# Altium footprint library ICs And Semiconductors SMD.PcbLib: 943 footprints (part 1 of 60)
Each footprint in its own frame and in the unit in brackets; x right, y up, seen from the top. Pads: shape width x height; smd on the part's side, far side on the other; paste and mask are expansions set on the pad; w line width, h text height; cw(c..) or ccw(c..) is an arc to the next point about the centre after c.
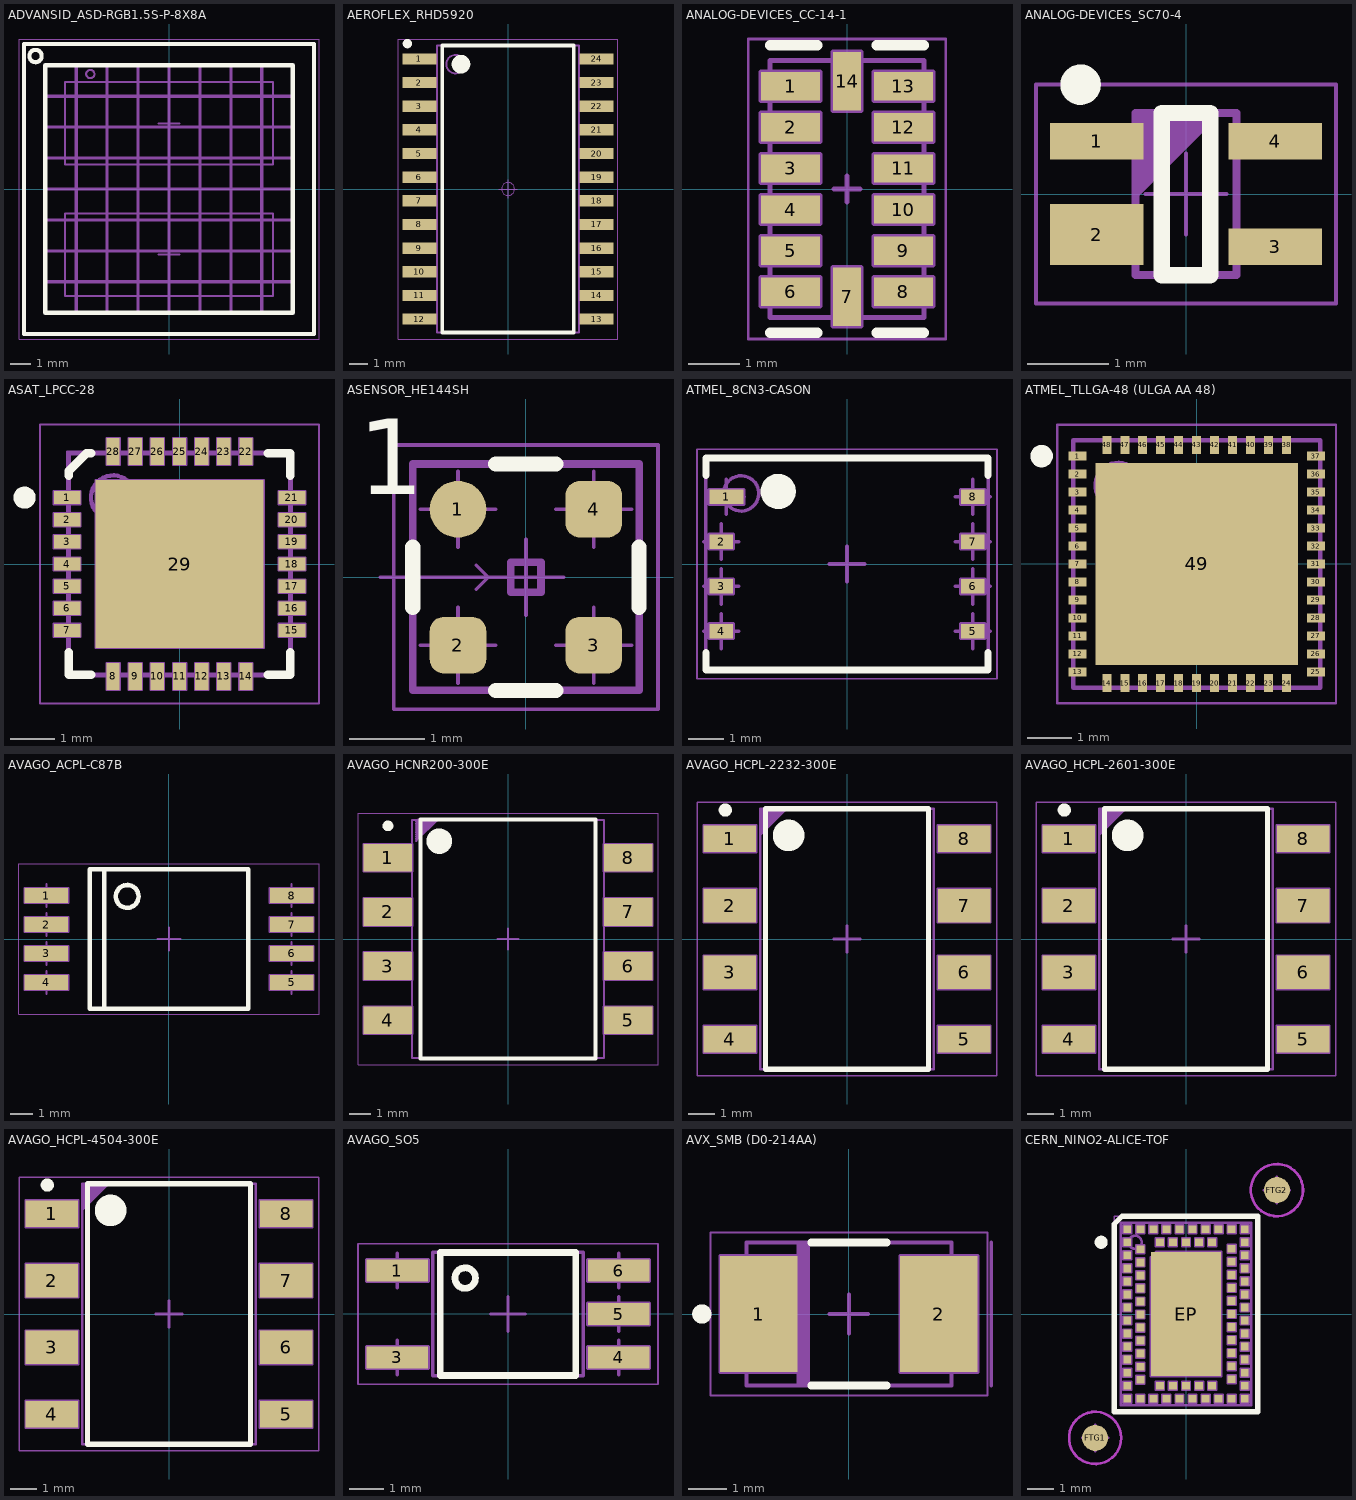
[diagram p0: the footprints below, top view; thin cyan lines are the x and y axes]

## ADVANSID_ASD-RGB1.5S-P-8X8A [mm] "8x8 Monolithic Array of 1.5x1.5 mm2 SiPMs (Silicon PhotoMultiplier), Body 14.05 x 14.05x 2.7mm"
height 2.7
Top Overlay:
  circle w0.2: c-6.475,6.45 r0.3
  lines w0.2: -7.025,-7.025 7.025,-7.025 7.025,7.025 -7.025,7.025 -7.025,-7.025 ; -6,-6 6,-6 6,6 -6,6 -6,-6
Mechanical 8:
  lines w0.1: -0.5,-3.18 0,-3.18 ; -0.5,0 0,0 ; -0.5,3.18 0,3.18 ; 0,-3.68 0,-3.18 ; 0,-2.68 0,-3.18 ; 0,-0.5 0,0 ; 0,0.5 0,0 ; 0,2.68 0,3.18 ; 0,3.68 0,3.18 ; 0.5,-3.18 0,-3.18 ; 0.5,0 0,0 ; 0.5,3.18 0,3.18 ; -5.05,-5.18 5.05,-5.18 5.05,-1.18 -5.05,-1.18 -5.05,-5.18 ; -5.05,1.18 5.05,1.18 5.05,5.18 -5.05,5.18 -5.05,1.18
  text "1" at -4.625,4.05 h0.8
  text "20" at 3.425,4.125 h0.8
  text "21" at 3.325,1.5 h0.8
  text "40" at -4.825,1.7 h0.8
  text "80" at -4.825,-4.66 h0.8
  text "61" at 3.325,-4.86 h0.8
  text "60" at 3.425,-2.235 h0.8
  text "41" at -4.625,-2.31 h0.8
Mechanical 14:
  drawing of 266 lines, arcs and shapes, not listed
  text "1" at -5.375,4.875 h0.8
  text "64" at 4.6,-5.65 h0.8
  text "9" at -5.525,3.375 h0.8
  text "8" at 5.125,4.875 h0.8
Mechanical 15:
  lines w0.05: -7.275,-7.275 7.275,-7.275 7.275,7.275 -7.275,7.275 -7.275,-7.275
3D body "ADVANSID_ASD-RGB1.5S-P-8X8A.stp": height 3, standoff 0.3, extent -7.025,-7.025 7.025,7.025

## AEROFLEX_RHD5920 [mm] "Hermetic Ceramic SOIC, 1.27mm Pitch; 24 Pin, 7.62mm W X 15.59mm L X 3.048mm H Body"
height 3.048
pads (24):
  rect 1.8x0.6 smd: 1(-4.75,6.985) 2(-4.75,5.715) 3(-4.75,4.445) 4(-4.75,3.175) 5(-4.75,1.905) 6(-4.75,0.635) 7(-4.75,-0.635) 8(-4.75,-1.905) 9(-4.75,-3.175) 10(-4.75,-4.445) 11(-4.75,-5.715) 12(-4.75,-6.985) 13(4.75,-6.985) 14(4.75,-5.715) 15(4.75,-4.445) 16(4.75,-3.175) 17(4.75,-1.905) 18(4.75,-0.635) 19(4.75,0.635) 20(4.75,1.905) 21(4.75,3.175) 22(4.75,4.445) 23(4.75,5.715) 24(4.75,6.985)
Top Overlay:
  circle w0.25: c-5.4,7.8 r0.125
  circle w0.5: c-2.525,6.7 r0.25
  lines w0.2: -3.525,-7.7 -3.525,7.7 3.525,7.7 3.525,-7.7 -3.525,-7.7
Mechanical 14:
  circle w0.1: c-2.81,6.7 r0.5
  lines w0.1: -3.81,-7.7 -3.81,7.7 3.81,7.7 3.81,-7.7 -3.81,-7.7
Mechanical 15:
  circle w0.05: c0,0 r0.35
  lines w0.05: -0.5,0 0.5,0 ; 0,-0.5 0,0.5 ; -5.9,-8.05 -5.9,8.05 5.9,8.05 5.9,-8.05 -5.9,-8.05
3D body "AEROFLEX_RHD5920.stp": height 3.05, standoff 0, extent -5.16,-7.8 5.16,7.8

## ANALOG-DEVICES_CC-14-1 [mm] "LGA, 0.50mm pitch, 14 Pin, 3.00mm L X 5.00mm W X 1.00mm H body, ANALOG DEVICE CC-14-1"
height 1
pads (14):
  rect 1.145x0.55 smd: 1(-1.098,2) 2(-1.098,1.2) 3(-1.098,0.4) 4(-1.098,-0.4) 5(-1.098,-1.2) 6(-1.098,-2) 8(1.098,-2) 9(1.098,-1.2) 10(1.098,-0.4) 11(1.098,0.4) 12(1.098,1.2) 13(1.098,2)
  rect 0.55x1.145 smd: 7(0,-2.098) 14(0,2.098)
Top Overlay:
  lines w0.2: -1.5,-2.8 -0.575,-2.8 ; -1.5,2.8 -0.575,2.8 ; 0.575,-2.8 1.5,-2.8 ; 0.575,2.8 1.5,2.8
Mechanical 8:
  lines w0.1: -1.348,-2 -1.098,-2 ; -1.348,-1.2 -1.098,-1.2 ; -1.348,-0.4 -1.098,-0.4 ; -1.348,0.4 -1.098,0.4 ; -1.348,1.2 -1.098,1.2 ; -1.348,2 -1.098,2 ; -1.098,-2.25 -1.098,-2 ; -1.098,-1.75 -1.098,-2 ; -1.098,-1.45 -1.098,-1.2 ; -1.098,-0.95 -1.098,-1.2 ; -1.098,-0.65 -1.098,-0.4 ; -1.098,-0.15 -1.098,-0.4 ; -1.098,0.15 -1.098,0.4 ; -1.098,0.65 -1.098,0.4 ; -1.098,0.95 -1.098,1.2 ; -1.098,1.45 -1.098,1.2 ; -1.098,1.75 -1.098,2 ; -1.098,2.25 -1.098,2 ; -0.848,-2 -1.098,-2 ; -0.848,-1.2 -1.098,-1.2 ; -0.848,-0.4 -1.098,-0.4 ; -0.848,0.4 -1.098,0.4 ; -0.848,1.2 -1.098,1.2 ; -0.848,2 -1.098,2 ; -0.25,-2.098 0,-2.098 ; -0.25,0 0,0 ; -0.25,2.098 0,2.098 ; 0,-2.348 0,-2.098 ; 0,-1.848 0,-2.098 ; 0,-0.25 0,0 ; 0,0.25 0,0 ; 0,1.848 0,2.098 ; 0,2.348 0,2.098 ; 0.25,-2.098 0,-2.098 ; 0.25,0 0,0 ; 0.25,2.098 0,2.098 ; 0.848,-2 1.098,-2 ; 0.848,-1.2 1.098,-1.2 ; 0.848,-0.4 1.098,-0.4 ; 0.848,0.4 1.098,0.4 ; 0.848,1.2 1.098,1.2 ; 0.848,2 1.098,2 ; 1.098,-2.25 1.098,-2 ; 1.098,-1.75 1.098,-2 ; 1.098,-1.45 1.098,-1.2 ; 1.098,-0.95 1.098,-1.2 ; 1.098,-0.65 1.098,-0.4 ; 1.098,-0.15 1.098,-0.4 ; 1.098,0.15 1.098,0.4 ; 1.098,0.65 1.098,0.4 ; 1.098,0.95 1.098,1.2 ; 1.098,1.45 1.098,1.2 ; 1.098,1.75 1.098,2 ; 1.098,2.25 1.098,2 ; 1.348,-2 1.098,-2 ; 1.348,-1.2 1.098,-1.2 ; 1.348,-0.4 1.098,-0.4 ; 1.348,0.4 1.098,0.4 ; 1.348,1.2 1.098,1.2 ; 1.348,2 1.098,2 ; -1.67,-2.275 -0.525,-2.275 -0.525,-1.725 -1.67,-1.725 -1.67,-2.275 ; -1.67,-1.475 -0.525,-1.475 -0.525,-0.925 -1.67,-0.925 -1.67,-1.475 ; -1.67,-0.675 -0.525,-0.675 -0.525,-0.125 -1.67,-0.125 -1.67,-0.675 ; -1.67,0.125 -0.525,0.125 -0.525,0.675 -1.67,0.675 -1.67,0.125 ; -1.67,0.925 -0.525,0.925 -0.525,1.475 -1.67,1.475 -1.67,0.925 ; -1.67,1.725 -0.525,1.725 -0.525,2.275 -1.67,2.275 -1.67,1.725 ; -0.275,-2.67 0.275,-2.67 0.275,-1.525 -0.275,-1.525 -0.275,-2.67 ; -0.275,1.525 0.275,1.525 0.275,2.67 -0.275,2.67 -0.275,1.525 ; 0.525,-2.275 0.525,-1.725 1.67,-1.725 1.67,-2.275 0.525,-2.275 ; 0.525,-1.475 0.525,-0.925 1.67,-0.925 1.67,-1.475 0.525,-1.475 ; 0.525,-0.675 0.525,-0.125 1.67,-0.125 1.67,-0.675 0.525,-0.675 ; 0.525,0.125 0.525,0.675 1.67,0.675 1.67,0.125 0.525,0.125 ; 0.525,0.925 0.525,1.475 1.67,1.475 1.67,0.925 0.525,0.925 ; 0.525,1.725 0.525,2.275 1.67,2.275 1.67,1.725 0.525,1.725
Mechanical 14:
  circle w0.1: c-1,2 r0.25
  lines w0.1: -1.5,-2.5 -1.5,2.5 1.5,2.5 1.5,-2.5 -1.5,-2.5
Mechanical 15:
  lines w0.05: -1.92,-2.92 -1.92,2.92 1.92,2.92 1.92,-2.92 -1.92,-2.92
3D body "ANALOG-DEVICES_CC-14-1.stp": height 0.79, standoff 0, extent -1.5,-2.5 1.5,2.5

## ANALOG-DEVICES_SC70-4 [mm] "SC70-4, SOT, 0.65mm Pitch, 4 pin, 1.25mm W X 2.00mm L X 1.10mm H, IPC Medium Density"
height 1.1
pads (4):
  rect 1.15x0.45 smd: 1(-1.1,0.65) 3(1.1,-0.65) 4(1.1,0.65)
  rect 1.15x0.75 smd: 2(-1.1,-0.5)
Top Overlay:
  circle w0.25: c-1.3,1.35 r0.125
  lines w0.2: -0.3,-1 -0.3,1 0.3,1 0.3,-1 -0.3,-1
Mechanical 14:
  lines w0.1: -0.625,0 0.375,1 ; -0.625,0.1 0.275,1 ; -0.625,0.2 0.175,1 ; -0.625,0.3 0.075,1 ; -0.625,0.4 -0.025,1 ; -0.625,0.5 -0.125,1 ; -0.625,0.6 -0.225,1 ; -0.625,0.7 -0.325,1 ; -0.625,0.8 -0.425,1 ; -0.625,0.9 -0.525,1 ; -0.625,-1 -0.625,1 0.625,1 0.625,-1 -0.625,-1
Mechanical 15:
  lines w0.05: -0.5,0 0.5,0 ; 0,-0.5 0,0.5 ; -1.85,-1.35 -1.85,1.35 1.85,1.35 1.85,-1.35 -1.85,-1.35
3D body "ANALOG-DEVICES_SC70-4.stp": height 1.1, standoff 0, extent -1.2,-1.1 1.2,1.1

## ASAT_LPCC-28 [mm] "QFN, 0.50mm Pitch, Square; 28 Pin, 5.00mm L X 5.00mm W X 1.0mm H Body (w/thermal tab 3.8 X 3.8mm)"
height 1
pads (29):
  rect 0.6x0.3 smd: 1(-2.54,1.5) 2(-2.54,1) 3(-2.54,0.5) 4(-2.54,0) 5(-2.54,-0.5) 6(-2.54,-1) 7(-2.54,-1.5) 15(2.54,-1.5) 16(2.54,-1) 17(2.54,-0.5) 18(2.54,0) 19(2.54,0.5) 20(2.54,1) 21(2.54,1.5)
  rect 0.3x0.6 smd: 8(-1.5,-2.54) 9(-1,-2.54) 10(-0.5,-2.54) 11(0,-2.54) 12(0.5,-2.54) 13(1,-2.54) 14(1.5,-2.54) 22(1.5,2.54) 23(1,2.54) 24(0.5,2.54) 25(0,2.54) 26(-0.5,2.54) 27(-1,2.54) 28(-1.5,2.54)
  rect 3.8x3.8 smd: 29(0,0)
Top Overlay:
  circle w0.25: c-3.5,1.5 r0.125
  lines w0.2: -2.5,-2 -2.5,-2.5 -2,-2.5 ; -2.5,2 -2.5,2.1 -2.1,2.5 -2,2.5 ; 2,-2.5 2.5,-2.5 2.5,-2 ; 2,2.5 2.5,2.5 2.5,2
Mechanical 8:
  drawing of 180 lines, arcs and shapes, not listed
Mechanical 14:
  circle w0.1: c-1.5,1.5 r0.5
  lines w0.1: -2.5,-2.5 2.5,-2.5 2.5,2.5 -2.5,2.5 -2.5,-2.5
Mechanical 15:
  circle w0.05: c0,0 r0.35
  lines w0.05: -0.5,0 0.5,0 ; 0,-0.5 0,0.5 ; -3.15,-3.15 3.15,-3.15 3.15,3.15 -3.15,3.15 -3.15,-3.15
3D body "QFN50P500X500X100-29N-S380.stp": height 1, standoff 0, extent -2.5,-2.5 2.5,2.5

## ASENSOR_HE144SH [mm] "HE144 Series Analog Hall Sensor, Body 3mm x 3mm x 0.5mm"
height 0.5
pads (4):
  round 0.75 smd: 1(-0.9,0.9)
  rrect50% 0.75x0.75 smd: 2(-0.9,-0.9) 3(0.9,-0.9) 4(0.9,0.9)
Top Overlay:
  lines w0.2: -1.5,-0.4 -1.5,0.4 ; -0.4,-1.5 0.4,-1.5 ; -0.4,1.5 0.4,1.5 ; 1.5,-0.4 1.5,0.4
  text "1" at -2.225,1.1 h1
Mechanical 8:
  circle w0.05: c-0.9,0.9 r0.3
  lines w0.05: -1.925,0 -0.5,0 ; -1.4,-0.9 -0.9,-0.9 ; -1.4,0.9 -0.9,0.9 ; -0.9,-1.4 -0.9,-0.9 ; -0.9,-0.4 -0.9,-0.9 ; -0.9,0.4 -0.9,0.9 ; -0.9,1.4 -0.9,0.9 ; -0.659,0.159 -0.5,0 ; -0.4,-0.9 -0.9,-0.9 ; -0.4,0.9 -0.9,0.9 ; 0,-0.5 0,0 ; 0,0.5 0,0 ; 0.4,-0.9 0.9,-0.9 ; 0.4,0.9 0.9,0.9 ; 0.5,0 0,0 ; 0.9,-1.4 0.9,-0.9 ; 0.9,-0.4 0.9,-0.9 ; 0.9,0.4 0.9,0.9 ; 0.9,1.4 0.9,0.9 ; 1.4,-0.9 0.9,-0.9 ; 1.4,0.9 0.9,0.9 ; -0.5,0 0,0 ; -0.5,0 -0.659,-0.159 -0.5,0 ; -1.2,-1.2 -0.6,-1.2 -0.6,-0.6 -1.2,-0.6 -1.2,-1.2 ; 0.6,-1.2 0.6,-0.6 1.2,-0.6 1.2,-1.2 0.6,-1.2 ; 0.6,0.6 0.6,1.2 1.2,1.2 1.2,0.6 0.6,0.6
  text "Center" at -4.625,-0.925 h0.5
  text "Magnetic" at -5.55,-0.175 h0.5
Mechanical 14:
  lines w0.1: -1.5,-1.5 1.5,-1.5 1.5,1.5 -1.5,1.5 -1.5,-1.5 ; -0.2,-0.2 -0.2,0.2 0.2,0.2 0.2,-0.2 -0.2,-0.2
  text "1" at -2.225,1.1 h1
Mechanical 15:
  lines w0.05: -1.75,-1.75 -1.75,1.75 1.75,1.75 1.75,-1.75 -1.75,-1.75
3D body "ASENSOR_HE144SH.stp": height 0.5, standoff 0, extent -1.5,-1.5 1.5,1.5

## ATMEL_8CN3-CASON [mm] "ATMEL 8CN3 Case, SON, 1.27mm Pitch; 8 Pin, 8.00mm W X 6.00mm L X 1.00mm H body"
height 1
pads (8):
  rect 0.97x0.41 smd: 1(-3.415,1.905)
  rect 0.67x0.41 smd: 2(-3.565,0.635) 3(-3.565,-0.635) 4(-3.565,-1.905) 5(3.565,-1.905) 6(3.565,-0.635) 7(3.565,0.635) 8(3.565,1.905)
Top Overlay:
  circle w0.5: c-1.95,2.055 r0.25
  lines w0.2: -4,-2.51 -4,-3 4,-3 4,-2.51 ; -4,2.51 -4,3 4,3 4,2.51
Mechanical 8:
  lines w0.1: -4.065,-1.905 -3.565,-1.905 ; -4.065,-0.635 -3.565,-0.635 ; -4.065,0.635 -3.565,0.635 ; -3.915,1.905 -3.415,1.905 ; -3.565,-2.405 -3.565,-1.905 ; -3.565,-1.405 -3.565,-1.905 ; -3.565,-1.135 -3.565,-0.635 ; -3.565,-0.135 -3.565,-0.635 ; -3.565,0.135 -3.565,0.635 ; -3.565,1.135 -3.565,0.635 ; -3.415,1.405 -3.415,1.905 ; -3.415,2.405 -3.415,1.905 ; -3.065,-1.905 -3.565,-1.905 ; -3.065,-0.635 -3.565,-0.635 ; -3.065,0.635 -3.565,0.635 ; -2.915,1.905 -3.415,1.905 ; -0.5,0 0,0 ; 0,-0.5 0,0 ; 0,0.5 0,0 ; 0.5,0 0,0 ; 3.065,-1.905 3.565,-1.905 ; 3.065,-0.635 3.565,-0.635 ; 3.065,0.635 3.565,0.635 ; 3.065,1.905 3.565,1.905 ; 3.565,-2.405 3.565,-1.905 ; 3.565,-1.405 3.565,-1.905 ; 3.565,-1.135 3.565,-0.635 ; 3.565,-0.135 3.565,-0.635 ; 3.565,0.135 3.565,0.635 ; 3.565,1.135 3.565,0.635 ; 3.565,1.405 3.565,1.905 ; 3.565,2.405 3.565,1.905 ; 4.065,-1.905 3.565,-1.905 ; 4.065,-0.635 3.565,-0.635 ; 4.065,0.635 3.565,0.635 ; 4.065,1.905 3.565,1.905 ; -3.9,-2.11 -3.23,-2.11 -3.23,-1.7 -3.9,-1.7 -3.9,-2.11 ; -3.9,-0.84 -3.23,-0.84 -3.23,-0.43 -3.9,-0.43 -3.9,-0.84 ; -3.9,0.43 -3.23,0.43 -3.23,0.84 -3.9,0.84 -3.9,0.43 ; -3.9,1.7 -2.93,1.7 -2.93,2.11 -3.9,2.11 -3.9,1.7 ; 3.23,-2.11 3.23,-1.7 3.9,-1.7 3.9,-2.11 3.23,-2.11 ; 3.23,-0.84 3.23,-0.43 3.9,-0.43 3.9,-0.84 3.23,-0.84 ; 3.23,0.43 3.9,0.43 3.9,0.84 3.23,0.84 3.23,0.43 ; 3.23,1.7 3.9,1.7 3.9,2.11 3.23,2.11 3.23,1.7
Mechanical 14:
  circle w0.1: c-3,2 r0.5
  lines w0.1: -4,-3 -4,3 4,3 4,-3 -4,-3
Mechanical 15:
  lines w0.05: -4.25,-3.25 -4.25,3.25 4.25,3.25 4.25,-3.25 -4.25,-3.25
3D body "ATMEL_8CN3-CASON.stp": height 1, standoff 0, extent -4,-3 4,3

## ATMEL_TLLGA-48 (ULGA AA 48) [mm] "QFN,0.40mm pitch,square;48 pin,5.50mm L X 5.50mm W X 0.60mm H body (w/pullback leads,thermal tab 4.5 X 4.5mm), IPC Medium Density"
height 0.6
pads (49):
  rect 0.4x0.2 smd: 1(-2.65,2.4) 2(-2.65,2) 3(-2.65,1.6) 4(-2.65,1.2) 5(-2.65,0.8) 6(-2.65,0.4) 7(-2.65,0) 8(-2.65,-0.4) 9(-2.65,-0.8) 10(-2.65,-1.2) 11(-2.65,-1.6) 12(-2.65,-2) 13(-2.65,-2.4) 25(2.65,-2.4) 26(2.65,-2) 27(2.65,-1.6) 28(2.65,-1.2) 29(2.65,-0.8) 30(2.65,-0.4) 31(2.65,0) 32(2.65,0.4) 33(2.65,0.8) 34(2.65,1.2) 35(2.65,1.6) 36(2.65,2) 37(2.65,2.4)
  rect 0.2x0.4 smd: 14(-2,-2.65) 15(-1.6,-2.65) 16(-1.2,-2.65) 17(-0.8,-2.65) 18(-0.4,-2.65) 19(0,-2.65) 20(0.4,-2.65) 21(0.8,-2.65) 22(1.2,-2.65) 23(1.6,-2.65) 24(2,-2.65) 38(2,2.65) 39(1.6,2.65) 40(1.2,2.65) 41(0.8,2.65) 42(0.4,2.65) 43(0,2.65) 44(-0.4,2.65) 45(-0.8,2.65) 46(-1.2,2.65) 47(-1.6,2.65) 48(-2,2.65)
  rect 4.5x4.5 smd: 49(0,0)
Top Overlay:
  circle w0.25: c-3.45,2.4 r0.125
Top Paste:
  region: -1.7,-1.7 -1.7,-0.28 -0.28,-0.28 -0.28,-1.7
  region: 0.28,-1.7 0.28,-0.28 1.7,-0.28 1.7,-1.7
  region: -1.7,0.28 -1.7,1.7 -0.28,1.7 -0.28,0.28
  region: 0.28,0.28 0.28,1.7 1.7,1.7 1.7,0.28
Mechanical 14:
  circle w0.1: c-1.75,1.75 r0.5
  lines w0.1: -2.75,-2.75 -2.75,2.75 2.75,2.75 2.75,-2.75 -2.75,-2.75
  text "1" at 0.45,-0.164 h0.75
Mechanical 15:
  circle w0.05: c0,0 r0.35
  lines w0.05: -0.5,0 0.5,0 ; 0,-0.5 0,0.5 ; -3.1,-3.1 -3.1,3.1 3.1,3.1 3.1,-3.1 -3.1,-3.1
3D body "ATMEL_TLLGA-48 (ULGA AA 48).stp": height 0.6, standoff 0, extent -2.75,-2.75 2.75,2.75

## AVAGO_ACPL-C87B [mm] "8-Leads Stretched Surface Mount SO Package, Body 6.807x5.859mm, Pitch 1.27mm"
height 3.6
pads (8):
  rect 1.905x0.64 smd: 1(-5.372,1.905) 2(-5.372,0.635) 3(-5.372,-0.635) 4(-5.372,-1.905) 5(5.373,-1.905) 6(5.373,-0.635) 7(5.373,0.635) 8(5.373,1.905)
Top Overlay:
  circle w0.2: c-1.832,1.867 r0.5
  lines w0.2: -2.832,-3.052 -2.832,3.052 ; -3.467,-3.052 -3.467,3.052 3.467,3.052 3.467,-3.052 -3.467,-3.052
Mechanical 8:
  lines w0.1: -5.872,-1.905 -5.372,-1.905 ; -5.872,-0.635 -5.372,-0.635 ; -5.872,0.635 -5.372,0.635 ; -5.872,1.905 -5.372,1.905 ; -5.372,-2.405 -5.372,-1.905 ; -5.372,-1.405 -5.372,-1.905 ; -5.372,-1.135 -5.372,-0.635 ; -5.372,-0.135 -5.372,-0.635 ; -5.372,0.135 -5.372,0.635 ; -5.372,1.135 -5.372,0.635 ; -5.372,1.405 -5.372,1.905 ; -5.372,2.405 -5.372,1.905 ; -4.872,-1.905 -5.372,-1.905 ; -4.872,-0.635 -5.372,-0.635 ; -4.872,0.635 -5.372,0.635 ; -4.872,1.905 -5.372,1.905 ; -0.5,0 0,0 ; 0,-0.5 0,0 ; 0,0.5 0,0 ; 0.5,0 0,0 ; 4.873,-1.905 5.373,-1.905 ; 4.873,-0.635 5.373,-0.635 ; 4.873,0.635 5.373,0.635 ; 4.873,1.905 5.373,1.905 ; 5.373,-2.405 5.373,-1.905 ; 5.373,-1.405 5.373,-1.905 ; 5.373,-1.135 5.373,-0.635 ; 5.373,-0.135 5.373,-0.635 ; 5.373,0.135 5.373,0.635 ; 5.373,1.135 5.373,0.635 ; 5.373,1.405 5.373,1.905 ; 5.373,2.405 5.373,1.905 ; 5.873,-1.905 5.373,-1.905 ; 5.873,-0.635 5.373,-0.635 ; 5.873,0.635 5.373,0.635 ; 5.873,1.905 5.373,1.905 ; -6.325,-2.225 -4.42,-2.225 -4.42,-1.585 -6.325,-1.585 -6.325,-2.225 ; -6.325,-0.955 -4.42,-0.955 -4.42,-0.315 -6.325,-0.315 -6.325,-0.955 ; -6.325,0.315 -4.42,0.315 -4.42,0.955 -6.325,0.955 -6.325,0.315 ; -6.325,1.585 -4.42,1.585 -4.42,2.225 -6.325,2.225 -6.325,1.585 ; 4.42,-2.225 6.325,-2.225 6.325,-1.585 4.42,-1.585 4.42,-2.225 ; 4.42,-0.955 6.325,-0.955 6.325,-0.315 4.42,-0.315 4.42,-0.955 ; 4.42,0.315 6.325,0.315 6.325,0.955 4.42,0.955 4.42,0.315 ; 4.42,1.585 6.325,1.585 6.325,2.225 4.42,2.225 4.42,1.585
Mechanical 14:
  circle w0.1: c-1.832,1.867 r0.5
  lines w0.1: -2.832,-3.052 -2.832,3.052 ; -3.467,-3.052 -3.467,3.052 3.467,3.052 3.467,-3.052 -3.467,-3.052
Mechanical 15:
  lines w0.05: -6.575,-3.302 6.575,-3.302 6.575,3.302 -6.575,3.302 -6.575,-3.302
3D body "AVAGO_ACPL-C87B.stp": height 3.61, standoff 0, extent -5.75,-3.052 5.75,3.052

## AVAGO_HCNR200-300E [mm] "DIP Gull Wing Surface Mount, 8-Leads, Body 11.15x9mm, Pitch 2.54mm"
height 4
pads (8):
  rect 2.29x1.3 smd: 1(-5.635,3.81) 2(-5.635,1.27) 3(-5.635,-1.27) 4(-5.635,-3.81) 5(5.635,-3.81) 6(5.635,-1.27) 7(5.635,1.27) 8(5.635,3.81)
Top Overlay:
  circle w0.6: c-3.22,4.585 r0.3
  circle w0.25: c-5.625,5.3 r0.125
  lines w0.2: -4.1,-5.6 -4.1,5.6 4.1,5.6 4.1,-5.6 -4.1,-5.6
Mechanical 8:
  lines w0.1: -6.135,-3.81 -5.635,-3.81 ; -6.135,-1.27 -5.635,-1.27 ; -6.135,1.27 -5.635,1.27 ; -6.135,3.81 -5.635,3.81 ; -5.635,-4.31 -5.635,-3.81 ; -5.635,-3.31 -5.635,-3.81 ; -5.635,-1.77 -5.635,-1.27 ; -5.635,-0.77 -5.635,-1.27 ; -5.635,0.77 -5.635,1.27 ; -5.635,1.77 -5.635,1.27 ; -5.635,3.31 -5.635,3.81 ; -5.635,4.31 -5.635,3.81 ; -5.135,-3.81 -5.635,-3.81 ; -5.135,-1.27 -5.635,-1.27 ; -5.135,1.27 -5.635,1.27 ; -5.135,3.81 -5.635,3.81 ; -0.5,0 0,0 ; 0,-0.5 0,0 ; 0,0.5 0,0 ; 0.5,0 0,0 ; 5.135,-3.81 5.635,-3.81 ; 5.135,-1.27 5.635,-1.27 ; 5.135,1.27 5.635,1.27 ; 5.135,3.81 5.635,3.81 ; 5.635,-4.31 5.635,-3.81 ; 5.635,-3.31 5.635,-3.81 ; 5.635,-1.77 5.635,-1.27 ; 5.635,-0.77 5.635,-1.27 ; 5.635,0.77 5.635,1.27 ; 5.635,1.77 5.635,1.27 ; 5.635,3.31 5.635,3.81 ; 5.635,4.31 5.635,3.81 ; 6.135,-3.81 5.635,-3.81 ; 6.135,-1.27 5.635,-1.27 ; 6.135,1.27 5.635,1.27 ; 6.135,3.81 5.635,3.81 ; -6.78,-4.46 -6.78,-3.16 -4.49,-3.16 -4.49,-4.46 -6.78,-4.46 ; -6.78,-1.92 -6.78,-0.62 -4.49,-0.62 -4.49,-1.92 -6.78,-1.92 ; -6.78,0.62 -6.78,1.92 -4.49,1.92 -4.49,0.62 -6.78,0.62 ; -6.78,3.16 -6.78,4.46 -4.49,4.46 -4.49,3.16 -6.78,3.16 ; 4.49,-4.46 4.49,-3.16 6.78,-3.16 6.78,-4.46 4.49,-4.46 ; 4.49,-1.92 6.78,-1.92 6.78,-0.62 4.49,-0.62 4.49,-1.92 ; 4.49,0.62 6.78,0.62 6.78,1.92 4.49,1.92 4.49,0.62 ; 4.49,3.16 6.78,3.16 6.78,4.46 4.49,4.46 4.49,3.16
Mechanical 14:
  lines w0.1: -4.3,4.6 -3.3,5.6 ; -4.3,4.7 -3.4,5.6 ; -4.3,4.8 -3.5,5.6 ; -4.3,4.9 -3.6,5.6 ; -4.3,5 -3.7,5.6 ; -4.3,5.1 -3.8,5.6 ; -4.3,5.2 -3.9,5.6 ; -4.3,5.3 -4,5.6 ; -4.3,5.4 -4.1,5.6 ; -4.3,5.5 -4.2,5.6 ; -4.5,-5.575 -4.5,5.575 4.5,5.575 4.5,-5.575 -4.5,-5.575
Mechanical 15:
  lines w0.05: -7.03,-5.9 7.03,-5.9 7.03,5.9 -7.03,5.9 -7.03,-5.9
3D body "AVAGO_HCNR200-300E.stp": height 4.01, standoff 0, extent -6.15,-5.65 6.15,5.65

## AVAGO_HCPL-2232-300E [mm] "SOIC, 2.54mm Pitch, 8 Pin, Body 6.35mm W X 9.65mm L X 4.45mm H, AVAGO 8-pin DIP Package With Gull Wing Surface Mount Option 300"
height 4.45
pads (8):
  rect 2x1.016 smd: 1(-4.45,3.81) 4(-4.45,-3.81) 5(4.45,-3.81) 8(4.45,3.81)
  rect 2x1.27 smd: 2(-4.45,1.27) 3(-4.45,-1.27) 6(4.45,-1.27) 7(4.45,1.27)
Top Overlay:
  circle w0.25: c-4.625,4.9 r0.125
  circle w0.6: c-2.22,3.935 r0.3
  lines w0.2: -3.1,-4.95 -3.1,4.95 3.1,4.95 3.1,-4.95 -3.1,-4.95
Mechanical 8:
  lines w0.1: -4.95,-3.81 -4.45,-3.81 ; -4.95,-1.27 -4.45,-1.27 ; -4.95,1.27 -4.45,1.27 ; -4.95,3.81 -4.45,3.81 ; -4.45,-4.31 -4.45,-3.81 ; -4.45,-3.31 -4.45,-3.81 ; -4.45,-1.77 -4.45,-1.27 ; -4.45,-0.77 -4.45,-1.27 ; -4.45,0.77 -4.45,1.27 ; -4.45,1.77 -4.45,1.27 ; -4.45,3.31 -4.45,3.81 ; -4.45,4.31 -4.45,3.81 ; -3.95,-3.81 -4.45,-3.81 ; -3.95,-1.27 -4.45,-1.27 ; -3.95,1.27 -4.45,1.27 ; -3.95,3.81 -4.45,3.81 ; -0.5,0 0,0 ; 0,-0.5 0,0 ; 0,0.5 0,0 ; 0.5,0 0,0 ; 3.95,-3.81 4.45,-3.81 ; 3.95,-1.27 4.45,-1.27 ; 3.95,1.27 4.45,1.27 ; 3.95,3.81 4.45,3.81 ; 4.45,-4.31 4.45,-3.81 ; 4.45,-3.31 4.45,-3.81 ; 4.45,-1.77 4.45,-1.27 ; 4.45,-0.77 4.45,-1.27 ; 4.45,0.77 4.45,1.27 ; 4.45,1.77 4.45,1.27 ; 4.45,3.31 4.45,3.81 ; 4.45,4.31 4.45,3.81 ; 4.95,-3.81 4.45,-3.81 ; 4.95,-1.27 4.45,-1.27 ; 4.95,1.27 4.45,1.27 ; 4.95,3.81 4.45,3.81 ; -5.45,-4.318 -3.45,-4.318 -3.45,-3.302 -5.45,-3.302 -5.45,-4.318 ; -5.45,-1.905 -5.45,-0.635 -3.45,-0.635 -3.45,-1.905 -5.45,-1.905 ; -5.45,0.635 -5.45,1.905 -3.45,1.905 -3.45,0.635 -5.45,0.635 ; -5.45,3.302 -3.45,3.302 -3.45,4.318 -5.45,4.318 -5.45,3.302 ; 3.45,-4.318 5.45,-4.318 5.45,-3.302 3.45,-3.302 3.45,-4.318 ; 3.45,-1.905 3.45,-0.635 5.45,-0.635 5.45,-1.905 3.45,-1.905 ; 3.45,0.635 3.45,1.905 5.45,1.905 5.45,0.635 3.45,0.635 ; 3.45,3.302 5.45,3.302 5.45,4.318 3.45,4.318 3.45,3.302
Mechanical 14:
  lines w0.1: -3.3,3.95 -2.3,4.95 ; -3.3,4.05 -2.4,4.95 ; -3.3,4.15 -2.5,4.95 ; -3.3,4.25 -2.6,4.95 ; -3.3,4.35 -2.7,4.95 ; -3.3,4.45 -2.8,4.95 ; -3.3,4.55 -2.9,4.95 ; -3.3,4.65 -3,4.95 ; -3.3,4.75 -3.1,4.95 ; -3.3,4.85 -3.2,4.95 ; -3.3,-4.95 -3.3,4.95 3.3,4.95 3.3,-4.95 -3.3,-4.95
Mechanical 15:
  lines w0.05: -5.7,-5.2 5.7,-5.2 5.7,5.2 -5.7,5.2 -5.7,-5.2
3D body "AVAGO_HCPL-2232-300E.stp": height 4.45, standoff 0, extent -4.95,-4.95 4.95,4.95

## AVAGO_HCPL-2601-300E [mm] "SOIC, 2.54mm Pitch, 8 Pin, Body 6.35mm W X 9.65mm L X 4.45mm H, AVAGO 8-pin DIP Package With Gull Wing Surface Mount Option 300"
height 4.45
pads (8):
  rect 2x1.016 smd: 1(-4.45,3.81) 4(-4.45,-3.81) 5(4.45,-3.81) 8(4.45,3.81)
  rect 2x1.27 smd: 2(-4.45,1.27) 3(-4.45,-1.27) 6(4.45,-1.27) 7(4.45,1.27)
Top Overlay:
  circle w0.6: c-2.22,3.935 r0.3
  circle w0.25: c-4.625,4.9 r0.125
  lines w0.2: -3.1,-4.95 3.1,-4.95 3.1,4.95 -3.1,4.95 -3.1,-4.95
Mechanical 8:
  lines w0.1: -4.95,-3.81 -4.45,-3.81 ; -4.95,-1.27 -4.45,-1.27 ; -4.95,1.27 -4.45,1.27 ; -4.95,3.81 -4.45,3.81 ; -4.45,-4.31 -4.45,-3.81 ; -4.45,-3.31 -4.45,-3.81 ; -4.45,-1.77 -4.45,-1.27 ; -4.45,-0.77 -4.45,-1.27 ; -4.45,0.77 -4.45,1.27 ; -4.45,1.77 -4.45,1.27 ; -4.45,3.31 -4.45,3.81 ; -4.45,4.31 -4.45,3.81 ; -3.95,-3.81 -4.45,-3.81 ; -3.95,-1.27 -4.45,-1.27 ; -3.95,1.27 -4.45,1.27 ; -3.95,3.81 -4.45,3.81 ; -0.5,0 0,0 ; 0,-0.5 0,0 ; 0,0.5 0,0 ; 0.5,0 0,0 ; 3.95,-3.81 4.45,-3.81 ; 3.95,-1.27 4.45,-1.27 ; 3.95,1.27 4.45,1.27 ; 3.95,3.81 4.45,3.81 ; 4.45,-4.31 4.45,-3.81 ; 4.45,-3.31 4.45,-3.81 ; 4.45,-1.77 4.45,-1.27 ; 4.45,-0.77 4.45,-1.27 ; 4.45,0.77 4.45,1.27 ; 4.45,1.77 4.45,1.27 ; 4.45,3.31 4.45,3.81 ; 4.45,4.31 4.45,3.81 ; 4.95,-3.81 4.45,-3.81 ; 4.95,-1.27 4.45,-1.27 ; 4.95,1.27 4.45,1.27 ; 4.95,3.81 4.45,3.81 ; -5.45,-4.318 -5.45,-3.302 -3.45,-3.302 -3.45,-4.318 -5.45,-4.318 ; -5.45,-1.905 -3.45,-1.905 -3.45,-0.635 -5.45,-0.635 -5.45,-1.905 ; -5.45,0.635 -3.45,0.635 -3.45,1.905 -5.45,1.905 -5.45,0.635 ; -5.45,3.302 -5.45,4.318 -3.45,4.318 -3.45,3.302 -5.45,3.302 ; 3.45,-4.318 3.45,-3.302 5.45,-3.302 5.45,-4.318 3.45,-4.318 ; 3.45,-1.905 5.45,-1.905 5.45,-0.635 3.45,-0.635 3.45,-1.905 ; 3.45,0.635 5.45,0.635 5.45,1.905 3.45,1.905 3.45,0.635 ; 3.45,3.302 3.45,4.318 5.45,4.318 5.45,3.302 3.45,3.302
Mechanical 14:
  lines w0.1: -3.3,3.95 -2.3,4.95 ; -3.3,4.05 -2.4,4.95 ; -3.3,4.15 -2.5,4.95 ; -3.3,4.25 -2.6,4.95 ; -3.3,4.35 -2.7,4.95 ; -3.3,4.45 -2.8,4.95 ; -3.3,4.55 -2.9,4.95 ; -3.3,4.65 -3,4.95 ; -3.3,4.75 -3.1,4.95 ; -3.3,4.85 -3.2,4.95 ; -3.3,-4.95 3.3,-4.95 3.3,4.95 -3.3,4.95 -3.3,-4.95
Mechanical 15:
  lines w0.05: -5.7,-5.2 -5.7,5.2 5.7,5.2 5.7,-5.2 -5.7,-5.2
3D body "AVAGO_HCPL-2601-300E.stp": height 4.45, standoff 0, extent -4.95,-4.95 4.95,4.95

## AVAGO_HCPL-4504-300E [mm] "SOIC, 2.54mm Pitch, 8 Pin, Body 6.35mm W X 9.65mm L X 4.45mm H, AVAGO 8-pin DIP Package With Gull Wing Surface Mount Option 300"
height 4.45
pads (8):
  rect 2x1.016 smd: 1(-4.45,3.81) 4(-4.45,-3.81) 5(4.45,-3.81) 8(4.45,3.81)
  rect 2x1.27 smd: 2(-4.45,1.27) 3(-4.45,-1.27) 6(4.45,-1.27) 7(4.45,1.27)
Top Overlay:
  circle w0.6: c-2.22,3.935 r0.3
  circle w0.25: c-4.625,4.9 r0.125
  lines w0.2: -3.1,-4.95 3.1,-4.95 3.1,4.95 -3.1,4.95 -3.1,-4.95
Mechanical 8:
  lines w0.1: -4.95,-3.81 -4.45,-3.81 ; -4.95,-1.27 -4.45,-1.27 ; -4.95,1.27 -4.45,1.27 ; -4.95,3.81 -4.45,3.81 ; -4.45,-4.31 -4.45,-3.81 ; -4.45,-3.31 -4.45,-3.81 ; -4.45,-1.77 -4.45,-1.27 ; -4.45,-0.77 -4.45,-1.27 ; -4.45,0.77 -4.45,1.27 ; -4.45,1.77 -4.45,1.27 ; -4.45,3.31 -4.45,3.81 ; -4.45,4.31 -4.45,3.81 ; -3.95,-3.81 -4.45,-3.81 ; -3.95,-1.27 -4.45,-1.27 ; -3.95,1.27 -4.45,1.27 ; -3.95,3.81 -4.45,3.81 ; -0.5,0 0,0 ; 0,-0.5 0,0 ; 0,0.5 0,0 ; 0.5,0 0,0 ; 3.95,-3.81 4.45,-3.81 ; 3.95,-1.27 4.45,-1.27 ; 3.95,1.27 4.45,1.27 ; 3.95,3.81 4.45,3.81 ; 4.45,-4.31 4.45,-3.81 ; 4.45,-3.31 4.45,-3.81 ; 4.45,-1.77 4.45,-1.27 ; 4.45,-0.77 4.45,-1.27 ; 4.45,0.77 4.45,1.27 ; 4.45,1.77 4.45,1.27 ; 4.45,3.31 4.45,3.81 ; 4.45,4.31 4.45,3.81 ; 4.95,-3.81 4.45,-3.81 ; 4.95,-1.27 4.45,-1.27 ; 4.95,1.27 4.45,1.27 ; 4.95,3.81 4.45,3.81 ; -5.45,-4.318 -5.45,-3.302 -3.45,-3.302 -3.45,-4.318 -5.45,-4.318 ; -5.45,-1.905 -3.45,-1.905 -3.45,-0.635 -5.45,-0.635 -5.45,-1.905 ; -5.45,0.635 -3.45,0.635 -3.45,1.905 -5.45,1.905 -5.45,0.635 ; -5.45,3.302 -5.45,4.318 -3.45,4.318 -3.45,3.302 -5.45,3.302 ; 3.45,-4.318 3.45,-3.302 5.45,-3.302 5.45,-4.318 3.45,-4.318 ; 3.45,-1.905 5.45,-1.905 5.45,-0.635 3.45,-0.635 3.45,-1.905 ; 3.45,0.635 5.45,0.635 5.45,1.905 3.45,1.905 3.45,0.635 ; 3.45,3.302 3.45,4.318 5.45,4.318 5.45,3.302 3.45,3.302
Mechanical 14:
  lines w0.1: -3.3,3.95 -2.3,4.95 ; -3.3,4.05 -2.4,4.95 ; -3.3,4.15 -2.5,4.95 ; -3.3,4.25 -2.6,4.95 ; -3.3,4.35 -2.7,4.95 ; -3.3,4.45 -2.8,4.95 ; -3.3,4.55 -2.9,4.95 ; -3.3,4.65 -3,4.95 ; -3.3,4.75 -3.1,4.95 ; -3.3,4.85 -3.2,4.95 ; -3.3,-4.95 3.3,-4.95 3.3,4.95 -3.3,4.95 -3.3,-4.95
Mechanical 15:
  lines w0.05: -5.7,-5.2 -5.7,5.2 5.7,5.2 5.7,-5.2 -5.7,-5.2
3D body "AVAGO_HCPL-4504-300E.stp": height 4.45, standoff 0, extent -4.95,-4.95 4.95,4.95

## AVAGO_SO5 [mm] "6-Leads Stretched Surface Mount SO Package, Pitch 1.27mm, Body 4.4x3.6mm, Pitch 1.27mm"
height 2.804
pads (5):
  rect 1.8x0.64 smd: 1(-3.23,1.27) 3(-3.23,-1.27) 4(3.23,-1.27) 5(3.23,0) 6(3.23,1.27)
Top Overlay:
  circle w0.2: c-1.25,1.05 r0.3
  lines w0.2: -1.98,-1.8 1.98,-1.8 1.98,1.8 -1.98,1.8 -1.98,-1.8
Mechanical 8:
  lines w0.1: -3.73,-1.27 -3.23,-1.27 ; -3.73,1.27 -3.23,1.27 ; -3.23,-1.77 -3.23,-1.27 ; -3.23,-0.77 -3.23,-1.27 ; -3.23,0.77 -3.23,1.27 ; -3.23,1.77 -3.23,1.27 ; -2.73,-1.27 -3.23,-1.27 ; -2.73,1.27 -3.23,1.27 ; -0.5,0 0,0 ; 0,-0.5 0,0 ; 0,0.5 0,0 ; 0.5,0 0,0 ; 2.73,-1.27 3.23,-1.27 ; 2.73,0 3.23,0 ; 2.73,1.27 3.23,1.27 ; 3.23,-1.77 3.23,-1.27 ; 3.23,-0.77 3.23,-1.27 ; 3.23,-0.5 3.23,0 ; 3.23,0.5 3.23,0 ; 3.23,0.77 3.23,1.27 ; 3.23,1.77 3.23,1.27 ; 3.73,-1.27 3.23,-1.27 ; 3.73,0 3.23,0 ; 3.73,1.27 3.23,1.27 ; -4.13,-1.59 -2.33,-1.59 -2.33,-0.95 -4.13,-0.95 -4.13,-1.59 ; -4.13,0.95 -2.33,0.95 -2.33,1.59 -4.13,1.59 -4.13,0.95 ; 2.33,-1.59 4.13,-1.59 4.13,-0.95 2.33,-0.95 2.33,-1.59 ; 2.33,-0.32 4.13,-0.32 4.13,0.32 2.33,0.32 2.33,-0.32 ; 2.33,0.95 4.13,0.95 4.13,1.59 2.33,1.59 2.33,0.95
Mechanical 14:
  circle w0.1: c-1.25,1.05 r0.3
  lines w0.1: -2.2,-1.8 2.2,-1.8 2.2,1.8 -2.2,1.8 -2.2,-1.8
Mechanical 15:
  lines w0.05: -4.38,-2.05 4.38,-2.05 4.38,2.05 -4.38,2.05 -4.38,-2.05
3D body "AVAGO_ACPL-M21L SO5.stp": height 2.5, standoff 0, extent -3.5,-1.8 3.5,1.8

## AVX_SMB (D0-214AA) [mm] "AVX SMB DO-214-AA Lead-less Chip Form, 2-Leads, Body 5.2x3.6mm"
height 1.2
pads (2):
  rect 2x3 smd: 1(-2.325,0) 2(2.325,0)
Top Overlay:
  circle w0.25: c-3.8,0 r0.125
  lines w0.2: -0.975,-1.85 0.975,-1.85 ; -0.975,1.85 0.975,1.85
Mechanical 8:
  lines w0.1: -2.825,0 -2.325,0 ; -2.325,-0.5 -2.325,0 ; -2.325,0.5 -2.325,0 ; -1.825,0 -2.325,0 ; -0.5,0 0,0 ; 0,-0.5 0,0 ; 0,0.5 0,0 ; 0.5,0 0,0 ; 1.825,0 2.325,0 ; 2.325,-0.5 2.325,0 ; 2.325,0.5 2.325,0 ; 2.825,0 2.325,0 ; 3.675,-1.85 3.675,1.85 ; -3.325,-1.5 -3.325,1.5 -1.325,1.5 -1.325,-1.5 -3.325,-1.5 ; 1.325,-1.5 3.325,-1.5 3.325,1.5 1.325,1.5 1.325,-1.5
Mechanical 14:
  lines w0.1: -2.65,-1.505 -1.5,-1.505 -1.5,1.505 -2.65,1.505 ; -1.3,-1.8 -1.3,1.8 ; -1.25,-1.8 -1.25,1.8 ; -1.2,-1.8 -1.2,1.8 ; -1.15,-1.8 -1.15,1.8 ; -1.1,-1.8 -1.1,1.8 ; -1.05,-1.8 -1.05,1.8 ; 2.65,-1.505 1.5,-1.505 1.5,1.505 2.65,1.505 ; -2.65,-1.85 2.65,-1.85 2.65,-0.7 cw(c2.65,0) 2.65,0.7 2.65,1.85 -2.65,1.85 -2.65,0.7 cw(c-2.65,0) -2.65,-0.7 -2.65,-1.85
Mechanical 15:
  lines w0.05: -3.575,-2.1 3.575,-2.1 3.575,2.1 -3.575,2.1 -3.575,-2.1
3D body "AVX_SMB (D0-214AA).stp": height 1.2, standoff 0, extent -2.65,-1.85 2.65,1.85

## CERN_NINO2-ALICE-TOF [mm] "TAPP Case 5mm X 7mm X 0.8mm H"
height 0.8
pads (79):
  rect 0.3x0.3 smd: A1(-2.25,2.75) A2(-2.25,2.25) A3(-2.25,1.75) A4(-2.25,1.25) A5(-2.25,0.75) A6(-2.25,0.25) A7(-2.25,-0.25) A8(-2.25,-0.75) A9(-2.25,-1.25) A10(-2.25,-1.75) A11(-2.25,-2.25) A12(-2.25,-2.75) A13(-2.25,-3.25) A14(-1.75,-3.25) A15(-1.25,-3.25) A16(-0.75,-3.25) A17(-0.25,-3.25) A18(0.25,-3.25) A19(0.75,-3.25) A20(1.25,-3.25) A21(1.75,-3.25) A22(2.25,-3.25) A23(2.25,-2.75) A24(2.25,-2.25) A25(2.25,-1.75) A26(2.25,-1.25) A27(2.25,-0.75) A28(2.25,-0.25) A29(2.25,0.25) A30(2.25,0.75) A31(2.25,1.25) A32(2.25,1.75) A33(2.25,2.25) A34(2.25,2.75) A35(2.25,3.25) A36(1.75,3.25) A37(1.25,3.25) A38(0.75,3.25) A39(0.25,3.25) A40(-0.25,3.25) A41(-0.75,3.25) A42(-1.25,3.25) A43(-1.75,3.25) A44(-2.25,3.25) B1(-1.75,2.48) B2(-1.75,1.98) B3(-1.75,1.48) B4(-1.75,0.98) B5(-1.75,0.48) B6(-1.75,-0.02) B7(-1.75,-0.52) B8(-1.75,-1.02) B9(-1.75,-1.52) B10(-1.75,-2.02) B11(-1.75,-2.52) B12(-1,-2.75) B13(-0.5,-2.75) B14(0,-2.75) B15(0.5,-2.75) B16(1,-2.75) B17(1.75,-2.5) B18(1.75,-2) B19(1.75,-1.5) B20(1.75,-1) B21(1.75,-0.5) B22(1.75,0) B23(1.75,0.5) B24(1.75,1) B25(1.75,1.5) B26(1.75,2) B27(1.75,2.5) B28(1,2.75) B29(0.5,2.75) B30(0,2.75) B31(-0.5,2.75) B32(-1,2.75)
  rect 2.7x4.75 smd: EP(0,0)
  round 1 smd paste-0.51 mask+0.5: FTG1(-3.483,-4.75) FTG2(3.483,4.75)
Top Layer keep-out:
  circle w0.1: c-3.483,-4.75 r1
  circle w0.1: c3.483,4.75 r1
Top Overlay:
  circle w0.25: c-3.25,2.75 r0.125
  lines w0.2: -2.75,-3.75 2.75,-3.75 2.75,3.75 -2.45,3.75 -2.75,3.45 -2.75,-3.75
Mechanical 8:
  drawing of 475 lines, arcs and shapes, not listed
Mechanical 14:
  circle w0.1: c-1.95,2.75 r0.25
  lines w0.1: -2.5,-3.5 2.5,-3.5 2.5,3.5 -2.5,3.5 -2.5,-3.5
Mechanical 15:
  lines w0.05: -2.75,-3.75 2.75,-3.75 2.75,3.75 -2.75,3.75 -2.75,-3.75
3D body "CERN_NINO2-ALICE-TOF.stp": height 0.8, standoff 0, extent -2.5,-3.5 2.5,3.5